# Altium footprint library IDC-Connectors.PcbLib: 32 footprints (part 1 of 2)
Each footprint in its own frame and in the unit in brackets; x right, y up, seen from the top. Pads: shape width x height; smd on the part's side, far side on the other; paste and mask are expansions set on the pad; w line width, h text height; cw(c..) or ccw(c..) is an arc to the next point about the centre after c.
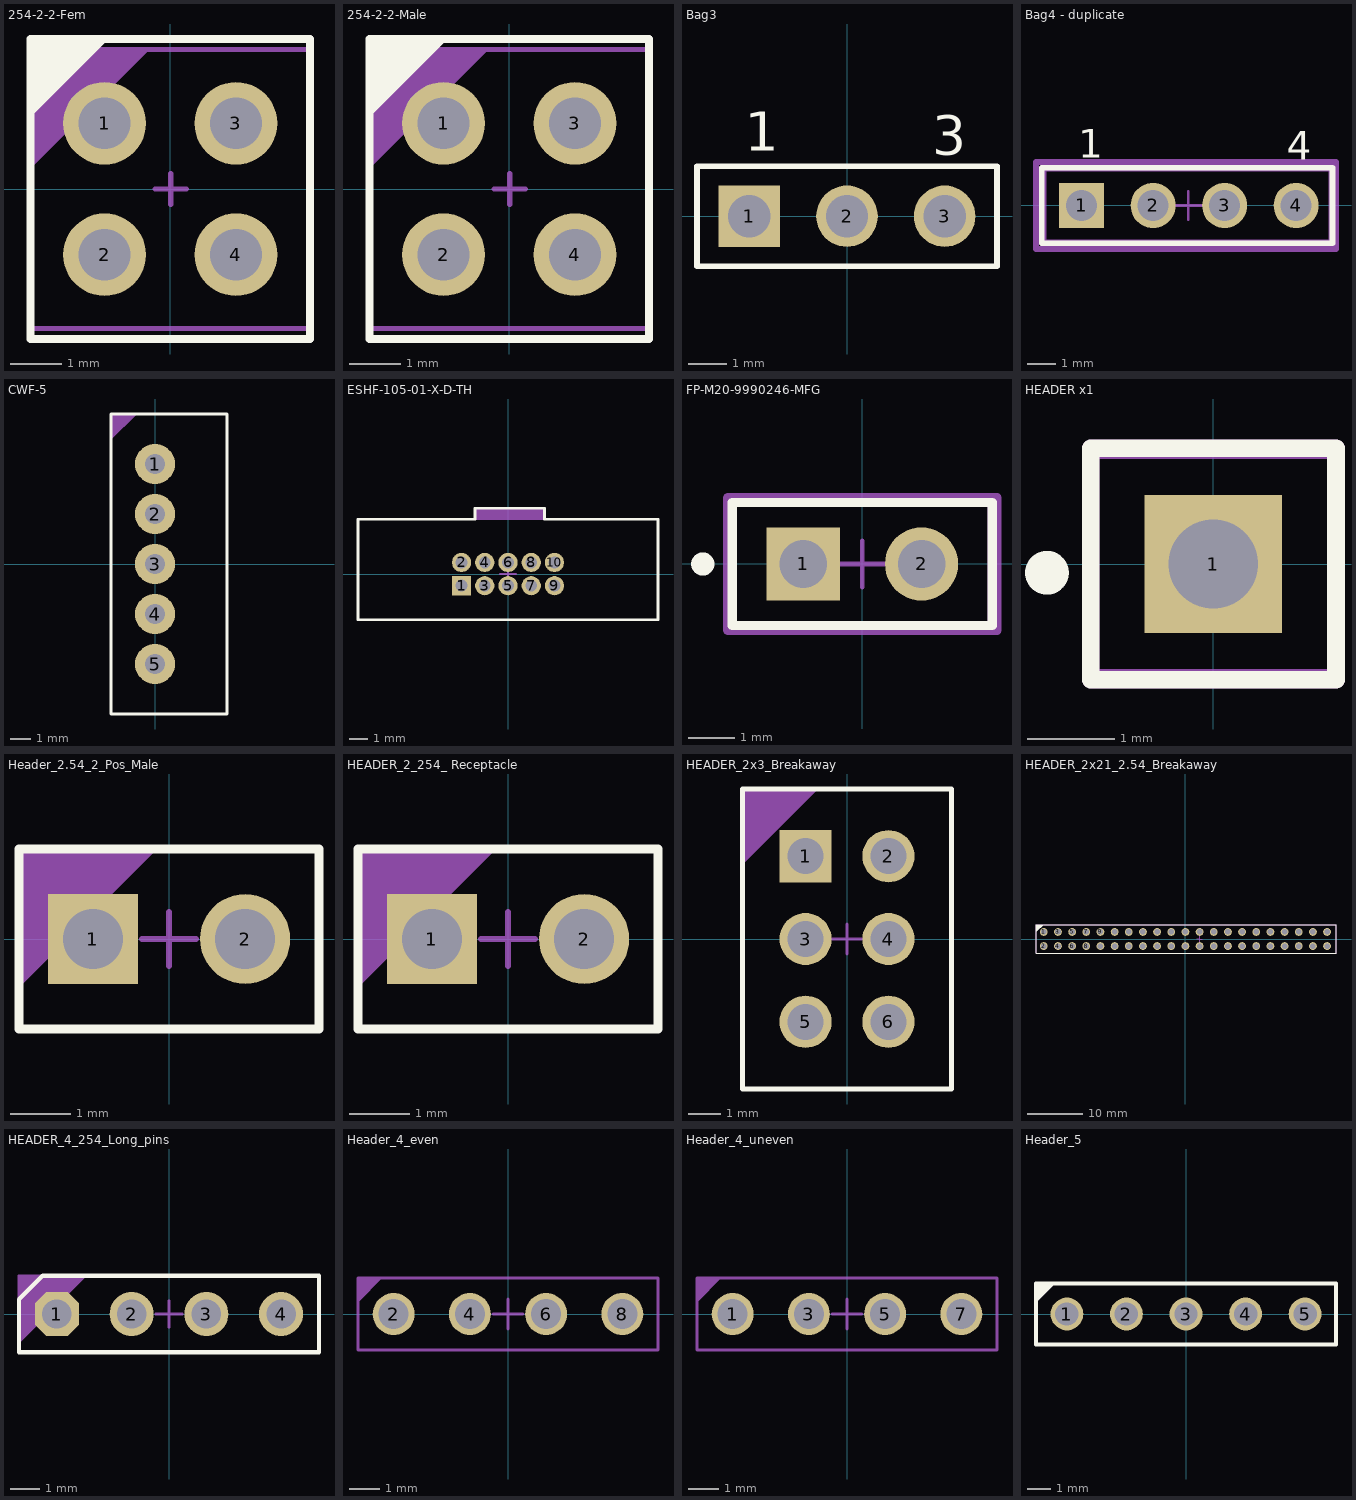
[diagram p0: the footprints below, top view; thin cyan lines are the x and y axes]

## 254-2-2-Fem [mm]
pads (4):
  round 1.6 hole 1 paste-2539.97: 1(-1.27,1.27) 2(-1.27,-1.27) 3(1.27,1.27) 4(1.27,-1.27)
Top Overlay:
  region: -2.75,2.85 -1.25,2.85 -2.75,1.35
  lines w0.153: -2.7,-2.9 2.7,-2.9 2.7,2.9 -2.7,2.9 -2.7,-2.9
Top Assembly:
  region: -2.7,2.7 -0.4,2.7 -2.7,0.4
  lines w0.1: -2.7,-2.7 -2.7,2.7 2.7,2.7 2.7,-2.7 -2.7,-2.7
  text "'.Designator'" at -4.532,-0.333 h0.8
Top Courtyard:
  lines w0.1: -0.29,0 0.31,0 ; 0.01,-0.3 0.01,0.3 ; -2.7,-2.9 -2.7,2.9 2.7,2.9 2.7,-2.9 -2.7,-2.9
3D body "4-Pin Header - Female - Double - 2.54mm.step": height 8.5, standoff -3, extent -2.52,-2.79 2.48,2.79

## 254-2-2-Male [mm]
pads (4):
  round 1.6 hole 1 paste-2539.97: 1(-1.27,1.27) 2(-1.27,-1.27) 3(1.27,1.27) 4(1.27,-1.27)
Top Overlay:
  region: -2.75,2.85 -1.25,2.85 -2.75,1.35
  lines w0.153: -2.7,-2.9 2.7,-2.9 2.7,2.9 -2.7,2.9 -2.7,-2.9
Top Assembly:
  region: -2.7,2.7 -0.4,2.7 -2.7,0.4
  lines w0.1: -2.7,-2.7 -2.7,2.7 2.7,2.7 2.7,-2.7 -2.7,-2.7
  text "'.Designator'" at -4.532,-0.333 h0.8
Top Courtyard:
  lines w0.1: -0.29,0 0.31,0 ; 0.01,-0.3 0.01,0.3 ; -2.7,-2.9 -2.7,2.9 2.7,2.9 2.7,-2.9 -2.7,-2.9
3D body "4-Pin Header - Male - Double - 2.54mm.step": height 8.89, standoff -3.05, extent -2.54,-2.54 2.54,2.54

## Bag3 [mm]
pads (3):
  rect 1.6x1.6 hole 1.1: 1(-2.54,0)
  round 1.6 hole 1.1: 2(0,0) 3(2.54,0)
Top Overlay:
  lines w0.153: -3.9,-1.3 -3.9,1.3 3.9,1.3 3.9,-1.3 -3.9,-1.3
  text "1" at -2.66,1.7 h1.02
  text "3" at 2.22,1.6 h1.02
Top Assembly:
  lines w0.1: -3.9,-1.3 -3.9,1.3 3.9,1.3 3.9,-1.3 -3.9,-1.3
  text "'.Designator'" at -4.532,-0.333 h0.8
Top Courtyard:
  lines w0.1: -0.5,0 0.5,0 ; 0,-0.5 0,0.5 ; -3.9,-1.3 -3.9,1.3 3.9,1.3 3.9,-1.3 -3.9,-1.3
3D body "81h5184_826629-3.stp": height 9.5, standoff -3.2, extent -3.81,-1.25 3.81,1.25

## Bag4 - duplicate [mm]
pads (4):
  rect 1.6x1.6 hole 1.1: 1(-10.16,0)
  round 1.6 hole 1.1: 2(-7.62,0) 3(-5.08,0) 4(-2.54,0)
Top Overlay:
  lines w0.2: -11.58,-1.345 -11.58,1.345 -1.25,1.345 -1.25,-1.345 -11.58,-1.345
  text "4" at -2.875,1.625 h1.02
  text "1" at -10.28,1.7 h1.02
Top Assembly:
  lines w0.1: -11.625,-1.27 -1.25,-1.27 -1.25,1.27 -11.625,1.27 -11.625,-1.27
  text "'.Designator'" at -11.647,3.095 h0.8
Top Courtyard:
  lines w0.1: -6.875,0 -5.875,0 ; -6.375,-0.5 -6.375,0.5
  lines w0.2: -11.78,-1.545 -1.125,-1.545 -1.125,1.545 -11.78,1.545 -11.78,-1.545 ; -11.5,-1.3 -11.5,1.3 -1.3,1.3 -1.3,-1.3 -11.5,-1.3
3D body "Conn_Harwin_M20-9990246_eec.STEP": height 8.99, standoff -2.94, extent -11.415,-1.271 -6.335,1.27
3D body "Conn_Harwin_M20-9990246_eec.STEP": height 8.99, standoff -2.94, extent -6.415,-1.271 -1.335,1.27

## CWF-5 [mm]
pads (5):
  round 2 hole 1: 1(0,5) 2(0,2.5) 3(0,0) 4(0,-2.5) 5(0,-5)
Top Overlay:
  lines w0.153: -2.2,-7.5 3.6,-7.5 3.6,7.5 -2.2,7.5 -2.2,-7.5
  text "." at -3.067,5.733 h0.8
Top Assembly:
  region: -2.2,7.5 -0.9,7.5 -2.2,6.2
  lines w0.1: -2.2,-7.5 -2.2,7.5 3.6,7.5 3.6,-7.5 -2.2,-7.5
  text "." at -3.067,5.733 h0.8
  text "'.Designator'" at 1.033,-4.532 h0.8
Top Courtyard:
  lines w0.1: -0.3,0 0.3,0 ; 0,-0.3 0,0.3 ; -2.2,-7.5 3.6,-7.5 3.6,7.5 -2.2,7.5 -2.2,-7.5
3D body "CWF-5.step": height 7, standoff -3.5, extent -2.2,-7.5 3.55,7.5

## ESHF-105-01-X-D-TH [mm]
pads (10):
  rect 1.05x1.05 hole 0.65: 1(-2.54,-0.635)
  round 1.05 hole 0.65: 2(-2.54,0.635) 3(-1.27,-0.635) 4(-1.27,0.635) 5(0,-0.635) 6(0,0.635) 7(1.27,-0.635) 8(1.27,0.635) 9(2.54,-0.635) 10(2.54,0.635)
Top Overlay:
  lines w0.153: -8.2,-2.5 8.2,-2.5 8.2,3 2,3 2,3.6 -1.8,3.6 -1.8,3 -6.8,3 -8.2,3 -8.2,-2.5
Top Assembly:
  rectangle: -1.8,3 1.9,3.6
  lines w0.1: -1.8,3 -1.8,3.6 1.9,3.6 1.9,3 ; -8.2,-2.5 8.2,-2.5 8.2,3 -8.2,3 -8.2,-2.5
  text "'.Designator'" at -4.532,-0.333 h0.8
Top Courtyard:
  lines w0.1: -0.45,0 0.45,0 ; 0,-0.45 0,0.45 ; -8.2,-2.5 -8.2,3 8.2,3 8.2,-2.5 -8.2,-2.5
3D body "ESHF-105-01-L-D-TH.stp": height 5.35, standoff -1.89, extent -8.255,-2.54 8.255,3.048

## FP-M20-9990246-MFG [mm]
pads (2):
  rect 1.57x1.57 hole 1.02 paste-2539.97 mask+0: 1(-1.27,0)
  round 1.57 hole 1.02 paste-2539.97 mask+0: 2(1.27,0)
Top Overlay:
  circle w0.25: c-3.425,0 r0.125
  lines w0.2: -2.79,-1.32 2.79,-1.32 2.79,1.32 -2.79,1.32 -2.79,-1.32
Top Assembly:
  lines w0.2: -2.79,-1.32 -2.79,1.32 2.79,1.32 2.79,-1.32 -2.79,-1.32
  text "'.Designator'" at -3.847,1.895 h0.8
Top Courtyard:
  lines w0.1: -0.5,0 0.5,0 ; 0,-0.5 0,0.5
  lines w0.2: -2.89,-1.42 2.89,-1.42 2.89,1.42 -2.89,1.42 -2.89,-1.42
3D body "Conn_Harwin_M20-9990246_eec.STEP": height 8.99, standoff -2.94, extent -2.54,-1.271 2.54,1.27

## HEADER x1 [mm]
pads (1):
  rect 1.57x1.57 hole 1.02 paste-2539.97 mask+0: 1(0,0)
Top Overlay:
  circle w0.25: c-1.9,-0.1 r0.125
  lines w0.2: -1.4,-1.32 1.4,-1.32 1.4,1.32 -1.4,1.32 -1.4,-1.32
Top Assembly:
  lines w0.2: -1.4,-1.32 -1.4,1.32 1.4,1.32 1.4,-1.32 -1.4,-1.32
  text "'.Designator'" at -1.547,1.995 h0.8
Top Courtyard:
  lines w0.2: -1.4,-1.3 1.4,-1.3 1.4,1.3 -1.4,1.3 -1.4,-1.3
Mechanical 13:
  lines w0.1: -0.5,0 0.5,0 ; 0,-0.5 0,0.5

## Header_2.54_2_Pos_Male [mm]
pads (2):
  rect 1.5x1.5 hole 1: 1(-1.27,0)
  round 1.5 hole 1: 2(1.27,0)
Top Overlay:
  lines w0.153: -2.5,-1.5 2.5,-1.5 2.5,1.5 -2.5,1.5 -2.5,-1.5
  text "." at -3.346,1.654 h1.52
Top Assembly:
  region: -2.5,1.5 -0.2,1.5 -2.5,-0.8
  lines w0.1: -2.5,-1.5 -2.5,1.5 2.5,1.5 2.5,-1.5 -2.5,-1.5
  text "'.Designator'" at -4.532,-0.333 h0.8
Top Courtyard:
  lines w0.1: -0.45,0 0.45,0 ; 0,-0.45 0,0.45 ; -2.5,-1.5 -2.5,1.5 2.5,1.5 2.5,-1.5 -2.5,-1.5
3D body "1x2 TH Vert 100mil.step": height 8.38, standoff -3.3, extent -2.513,-1.257 2.567,1.283

## HEADER_2_254_ Receptacle [mm]
pads (2):
  rect 1.5x1.5 hole 1: 1(-1.27,0)
  round 1.5 hole 1: 2(1.27,0)
Top Overlay:
  lines w0.153: -2.5,-1.5 2.5,-1.5 2.5,1.5 -2.5,1.5 -2.5,-1.5
  text "." at -3.346,1.654 h1.52
Top Assembly:
  region: -2.5,1.5 -0.2,1.5 -2.5,-0.8
  lines w0.1: -2.5,-1.5 -2.5,1.5 2.5,1.5 2.5,-1.5 -2.5,-1.5
  text "'.Designator'" at -4.532,-0.333 h0.8
Top Courtyard:
  lines w0.1: -0.45,0 0.45,0 ; 0,-0.45 0,0.45 ; -2.5,-1.5 -2.5,1.5 2.5,1.5 2.5,-1.5 -2.5,-1.5
3D body "zl262-2d_p2-54_l2-54_w5_h8-5.stp": height 8.5, standoff -3, extent -2.5,-1.52 2.5,1.52

## HEADER_2x3_Breakaway [mm]
pads (6):
  rect 1.6x1.6 hole 1.1: 1(-1.27,2.54)
  round 1.6 hole 1.1: 2(1.27,2.54) 3(-1.27,0) 4(1.27,0) 5(-1.27,-2.54) 6(1.27,-2.54)
Top Overlay:
  lines w0.153: -3.2,-4.6 -3.2,4.6 3.2,4.6 3.2,-4.6 -3.2,-4.6
  text "." at -4.096,4.989 h1.52
Top Assembly:
  region: -3.2,4.6 -0.9,4.6 -3.2,2.3
  lines w0.1: -3.2,-4.6 3.2,-4.6 3.2,4.6 -3.2,4.6 -3.2,-4.6
  text "'.Designator'" at 0.333,-4.532 h0.8
Top Courtyard:
  lines w0.1: -0.45,0 0.45,0 ; 0,-0.45 0,0.45 ; -3.2,-4.6 -3.2,4.6 3.2,4.6 3.2,-4.6 -3.2,-4.6
3D body "User Library-HEADER, 2X3, 2_54MM X 2_54MM PITCH, VERT, TH.step": height 8.38, standoff -3.81, extent -2.56,-3.86 2.52,3.76

## HEADER_2x21_2.54_Breakaway [mm]
pads (42):
  round 1.4 hole 1: 1(-25.4,1.27) 2(-25.4,-1.27) 3(-22.86,1.27) 4(-22.86,-1.27) 5(-20.32,1.27) 6(-20.32,-1.27) 7(-17.78,1.27) 8(-17.78,-1.27) 9(-15.24,1.27) 10(-15.24,-1.27) 11(-12.7,1.27) 12(-12.7,-1.27) 13(-10.16,1.27) 14(-10.16,-1.27) 15(-7.62,1.27) 16(-7.62,-1.27) 17(-5.08,1.27) 18(-5.08,-1.27) 19(-2.54,1.27) 20(-2.54,-1.27) 21(0,1.27) 22(0,-1.27) 23(2.54,1.27) 24(2.54,-1.27) 25(5.08,1.27) 26(5.08,-1.27) 27(7.62,1.27) 28(7.62,-1.27) 29(10.16,1.27) 30(10.16,-1.27) 31(12.7,1.27) 32(12.7,-1.27) 33(15.24,1.27) 34(15.24,-1.27) 35(17.78,1.27) 36(17.78,-1.27) 37(20.32,1.27) 38(20.32,-1.27) 39(22.86,1.27) 40(22.86,-1.27) 41(25.4,1.27) 42(25.4,-1.27)
Top Overlay:
  region: -26.75,2.6 -26.75,1.3 -25.45,2.6
  lines w0.153: -26.8,-2.6 -26.8,2.6 27,2.6 27,-2.6 -26.8,-2.6
Top Assembly:
  region: -26.8,2.6 -26.8,1.7 -25.9,2.6
  lines w0.1: -26.8,-2.6 27,-2.6 27,2.6 -26.8,2.6 -26.8,-2.6
  text ".Designator" at 6.539,-0.267 h0.8
Top Courtyard:
  lines w0.1: 2.04,0.005 2.54,0.005 2.54,-0.495 ; 2.536,0.5 2.536,0 3.036,0 ; -26.8,-2.6 27,-2.6 27,2.6 -26.8,2.6 -26.8,-2.6
3D body "10-89-7260.stp": height 8.44, standoff -2.66, extent -6.26,-2.54 26.76,2.54
3D body "10-89-7162.stp": height 8.44, standoff -2.66, extent -26.62,-2.54 -6.3,2.54

## HEADER_4_254_Long_pins [mm]
pads (4):
  oct 1.5x1.5 hole 1: 1(-3.81,0)
  round 1.5 hole 1: 2(-1.27,0) 3(1.27,0) 4(3.81,0)
Top Overlay:
  lines w0.153: -5.1,-1.3 5.1,-1.3 5.1,1.3 -4.3,1.3 -5.1,0.5 -5.1,-1.3
Top Assembly:
  region: -5.1,1.3 -2.8,1.3 -5.1,-1
  lines w0.1: -5.1,-1.3 5.1,-1.3 5.1,1.3 -5.1,1.3 -5.1,-1.3
  text "'.Designator'" at -4.532,-0.333 h0.8
Top Courtyard:
  lines w0.1: -0.45,0 0.45,0 ; 0,-0.45 0,0.45 ; -5.1,-1.3 5.1,-1.3 5.1,1.3 -5.1,1.3 -5.1,-1.3
3D body "ZW-04-15-F-S-325-152-LL.stp": height 12.14, standoff -3.86, extent -5.08,-1.27 5.08,1.27

## Header_4_even [mm]
pads (4):
  round 1.4 hole 1: 2(-3.81,0) 4(-1.27,0) 6(1.27,0) 8(3.81,0)
Bottom Overlay:
  region: -5,1.2 -5,0.4 -4.2,1.2
  lines w0.153: -5,0.4 -4.2,1.2 ; -5,-1.2 -5,1.2 5,1.2 5,-1.2 -5,-1.2
Top Assembly:
  region: -5,1.2 -5,0.4 -4.2,1.2
  lines w0.1: -5,-1.2 5,-1.2 5,1.2 -5,1.2 -5,-1.2
  text ".Designator" at -3.999,-0.267 h0.8
Top Courtyard:
  lines w0.1: -0.5,0.005 0,0.005 0,-0.495 ; -0.004,0.5 -0.004,0 0.496,0 ; -5,-1.2 -5,1.2 5,1.2 5,-1.2 -5,-1.2
3D body "MTLW-104-05-G-S-000.stp": height 1.52, standoff -6.98, extent -5.08,-1.245 5.08,1.245

## Header_4_uneven [mm]
pads (4):
  round 1.4 hole 1: 1(-3.81,0) 3(-1.27,0) 5(1.27,0) 7(3.81,0)
Bottom Overlay:
  region: -5,1.2 -5,0.4 -4.2,1.2
  lines w0.153: -5,0.4 -4.2,1.2 ; -5,-1.2 -5,1.2 5,1.2 5,-1.2 -5,-1.2
Top Assembly:
  region: -5,1.2 -5,0.4 -4.2,1.2
  lines w0.1: -5,-1.2 5,-1.2 5,1.2 -5,1.2 -5,-1.2
  text ".Designator" at -3.999,-0.267 h0.8
Top Courtyard:
  lines w0.1: -0.5,0.005 0,0.005 0,-0.495 ; -0.004,0.5 -0.004,0 0.496,0 ; -5,-1.2 -5,1.2 5,1.2 5,-1.2 -5,-1.2
3D body "MTLW-104-05-G-S-000.stp": height 1.52, standoff -6.98, extent -5.08,-1.245 5.08,1.245

## Header_5 [mm]
pads (5):
  round 1.4 hole 1: 1(-5.08,0) 2(-2.54,0) 3(0,0) 4(2.54,0) 5(5.08,0)
Top Overlay:
  region: -6.4,1.3 -6.4,0.5 -5.6,1.3
  lines w0.153: -6.4,-1.3 6.4,-1.3 6.4,1.3 -6.4,1.3 -6.4,-1.3
Top Assembly:
  region: -6.4,1.3 -6.4,0.5 -5.6,1.3
  lines w0.1: -6.4,-1.3 -6.4,1.3 6.4,1.3 6.4,-1.3 -6.4,-1.3
  text ".Designator" at -3.999,-0.267 h0.8
Top Courtyard:
  lines w0.1: -6.4,-1.2 -6.4,1.2 ; -5.1,-1.3 6.4,-1.3 6.4,1.3 -5.1,1.3 ; -0.5,0.005 0,0.005 0,-0.495 ; -0.004,0.5 -0.004,0 0.496,0
3D body "Download_STP_61300511121 (rev1).stp": height 2.57, standoff -8.97, extent -6.35,-1.27 6.35,1.27